# Altium footprint library Footprints.PcbLib: 236 footprints (part 14 of 15)
Each footprint in its own frame and in the unit in brackets; x right, y up, seen from the top. Pads: shape width x height; smd on the part's side, far side on the other; paste and mask are expansions set on the pad; w line width, h text height; cw(c..) or ccw(c..) is an arc to the next point about the centre after c.
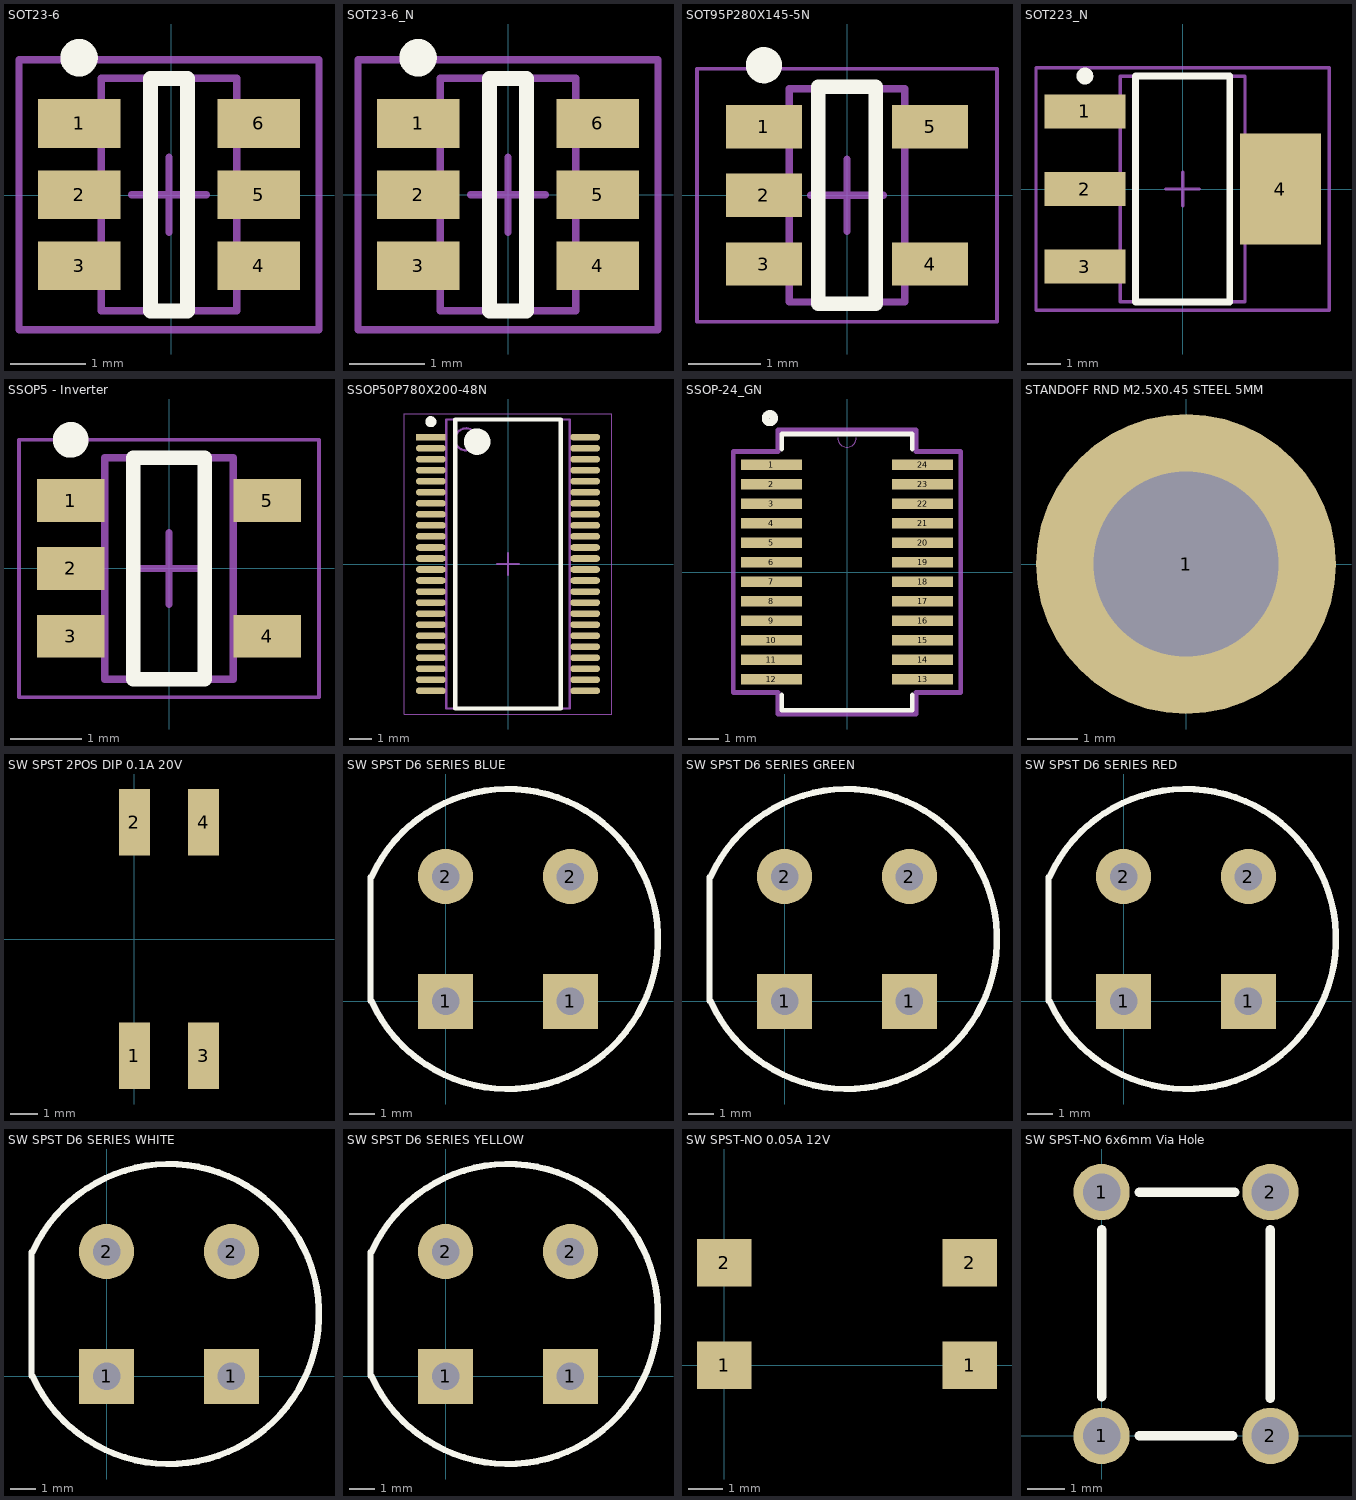
[diagram p13: the footprints below, top view; thin cyan lines are the x and y axes]

## SOT23-6 [mm]
pads (6):
  rect 1.1x0.65 smd: 1(-1.229,0.955) 2(-1.229,0.005) 3(-1.229,-0.945) 4(1.171,-0.945) 5(1.171,0.005) 6(1.171,0.955)
Top Overlay:
  circle w0.25: c-1.229,1.83 r0.125
  lines w0.2: -0.279,-1.545 0.221,-1.545 0.221,1.555 -0.279,1.555 -0.279,-1.545
Mechanical 13:
  lines w0.1: -0.929,-1.545 -0.929,1.555 0.871,1.555 0.871,-1.545 -0.929,-1.545
Mechanical 15:
  lines w0.1: -0.529,0.005 0.471,0.005 ; -0.029,-0.495 -0.029,0.505 ; -2.029,-1.795 -2.029,1.805 1.971,1.805 1.971,-1.795 -2.029,-1.795
3D body "IC REG BUCK 4.5V TO 17V, 5A.step": height 1.1, standoff 0, extent -1.525,-1.375 1.525,1.375

## SOT23-6_N [mm] "SOT23, 6-Leads, Body 2.9x1.6mm, Pitch 0.95mm, Lead Span 2.7mm, IPC Medium Density"
height 1.45
pads (6):
  rect 1.1x0.65 smd: 1(-1.2,0.95) 2(-1.2,0) 3(-1.2,-0.95) 4(1.2,-0.95) 5(1.2,0) 6(1.2,0.95)
Top Overlay:
  circle w0.25: c-1.2,1.825 r0.125
  lines w0.2: -0.25,-1.55 -0.25,1.55 0.25,1.55 0.25,-1.55 -0.25,-1.55
Mechanical 13:
  lines w0.1: -0.9,-1.55 0.9,-1.55 0.9,1.55 -0.9,1.55 -0.9,-1.55
Mechanical 15:
  lines w0.1: -0.5,0 0.5,0 ; 0,-0.5 0,0.5 ; -2,-1.8 2,-1.8 2,1.8 -2,1.8 -2,-1.8
3D body: height 1.45, standoff 0, extent -0.9,-1.55 0.9,1.55

## SOT95P280X145-5N [mm] "SOT23, 5-Leads, Body 2.95x2.80mm, Pitch 0.95mm, IPC Medium Density"
height 1.45
pads (5):
  rect 1.05x0.6 smd: 1(-1.15,0.95) 2(-1.15,0) 3(-1.15,-0.95) 4(1.15,-0.95) 5(1.15,0.95)
Top Overlay:
  circle w0.25: c-1.15,1.8 r0.125
  lines w0.2: -0.4,-1.5 0.4,-1.5 0.4,1.5 -0.4,1.5 -0.4,-1.5
Mechanical 13:
  lines w0.1: -0.8,-1.475 -0.8,1.475 0.8,1.475 0.8,-1.475 -0.8,-1.475
Mechanical 15:
  lines w0.05: -2.075,-1.75 -2.075,1.75 2.075,1.75 2.075,-1.75 -2.075,-1.75
  lines w0.1: -0.5,0 0.5,0 ; 0,-0.5 0,0.5
3D body "SOT95P280X145-5N.step": height 1.45, standoff 0, extent -1.4,-1.475 1.4,1.475

## SOT223_N [mm] "SOT223, 4-Leads, Body 6.5x3.5mm, Pitch 2.3mm, Lead Span 7mm, IPC Medium Density"
height 1.7
pads (4):
  rect 2.4x1 smd: 1(-2.9,2.3) 2(-2.9,0) 3(-2.9,-2.3)
  rect 2.4x3.3 smd: 4(2.9,0)
Top Overlay:
  circle w0.25: c-2.9,3.35 r0.125
  lines w0.2: -1.4,-3.35 1.4,-3.35 1.4,3.35 -1.4,3.35 -1.4,-3.35
Mechanical 13:
  lines w0.1: -1.85,-3.35 1.85,-3.35 1.85,3.35 -1.85,3.35 -1.85,-3.35
Mechanical 15:
  lines w0.1: -0.5,0 0.5,0 ; 0,-0.5 0,0.5 ; -4.35,-3.6 4.35,-3.6 4.35,3.6 -4.35,3.6 -4.35,-3.6
3D body "SOT223-3.step": height 1.6, standoff 0, extent -3.537,-3.3 3.537,3.2

## SSOP5 - Inverter [mm] "SSOP5, 5-Leads, Body 2.90x2.80mm, Pitch 0.95mm, IPC Medium Density"
height 1.2
pads (5):
  rect 0.95x0.6 smd: 1(-1.375,0.95) 2(-1.375,0) 3(-1.375,-0.95) 4(1.375,-0.95) 5(1.375,0.95)
Top Overlay:
  circle w0.25: c-1.375,1.8 r0.125
  lines w0.2: -0.5,-1.55 -0.5,1.55 0.5,1.55 0.5,-1.55 -0.5,-1.55
Mechanical 13:
  lines w0.1: -0.9,-1.55 0.9,-1.55 0.9,1.55 -0.9,1.55 -0.9,-1.55
Mechanical 15:
  lines w0.05: -2.1,-1.8 2.1,-1.8 2.1,1.8 -2.1,1.8 -2.1,-1.8
  lines w0.1: -0.5,0 0.5,0 ; 0,-0.5 0,0.5
3D body "SSOP5 - Inverter.step": height 1.2, standoff 0, extent -1.5,-1.55 1.5,1.55

## SSOP50P780X200-48N [mm] "SSOP, 48-Leads, Body 12.80x5.30mm, Pitch 0.50mm, IPC Medium Density"
height 2
pads (48):
  rect 1.35x0.3 smd: 1(-3.5,5.75)
  oval 1.35x0.3 smd: 2(-3.5,5.25) 3(-3.5,4.75) 4(-3.5,4.25) 5(-3.5,3.75) 6(-3.5,3.25) 7(-3.5,2.75) 8(-3.5,2.25) 9(-3.5,1.75) 10(-3.5,1.25) 11(-3.5,0.75) 12(-3.5,0.25) 13(-3.5,-0.25) 14(-3.5,-0.75) 15(-3.5,-1.25) 16(-3.5,-1.75) 17(-3.5,-2.25) 18(-3.5,-2.75) 19(-3.5,-3.25) 20(-3.5,-3.75) 21(-3.5,-4.25) 22(-3.5,-4.75) 23(-3.5,-5.25) 24(-3.5,-5.75) 25(3.5,-5.75) 26(3.5,-5.25) 27(3.5,-4.75) 28(3.5,-4.25) 29(3.5,-3.75) 30(3.5,-3.25) 31(3.5,-2.75) 32(3.5,-2.25) 33(3.5,-1.75) 34(3.5,-1.25) 35(3.5,-0.75) 36(3.5,-0.25) 37(3.5,0.25) 38(3.5,0.75) 39(3.5,1.25) 40(3.5,1.75) 41(3.5,2.25) 42(3.5,2.75) 43(3.5,3.25) 44(3.5,3.75) 45(3.5,4.25) 46(3.5,4.75) 47(3.5,5.25) 48(3.5,5.75)
Top Overlay:
  circle w0.25: c-3.5,6.45 r0.125
  circle w0.6: c-1.4,5.55 r0.3
  lines w0.2: -2.4,-6.55 -2.4,6.55 2.4,6.55 2.4,-6.55 -2.4,-6.55
Mechanical 13:
  circle w0.1: c-1.9,5.65 r0.5
  lines w0.1: -2.8,-6.55 -2.8,6.55 2.8,6.55 2.8,-6.55 -2.8,-6.55
Mechanical 15:
  lines w0.05: -4.7,-6.8 -4.7,6.8 4.7,6.8 4.7,-6.8 -4.7,-6.8
  lines w0.1: -0.5,0 0.5,0 ; 0,-0.5 0,0.5
3D body "SSOP50P780X200-48N.step": height 2, standoff 0, extent -3.9,-6.55 3.9,6.55

## SSOP-24_GN [mil]
pads (24):
  rect 78x14 smd: 1(-97,137.5) 2(-97,112.5) 3(-97,87.5) 4(-97,62.5) 5(-97,37.5) 6(-97,12.5) 7(-97,-12.5) 8(-97,-37.5) 9(-97,-62.5) 10(-97,-87.5) 11(-97,-112.5) 12(-97,-137.5) 13(97,-137.5) 14(97,-112.5) 15(97,-87.5) 16(97,-62.5) 17(97,-37.5) 18(97,-12.5) 19(97,12.5) 20(97,37.5) 21(97,62.5) 22(97,87.5) 23(97,112.5) 24(97,137.5)
Top Overlay:
  circle w10: c-98.94,197.2 r5.35
  lines w6: -83.5,-157.6 -83.5,-177 83.5,-177 83.5,-157.6 ; -83.5,157.6 -83.5,177 83.5,177 83.5,157.6
Mechanical 13:
  lines w0: -12,172 ccw(c0,172) 12,172
Mechanical 15:
  lines w6: -146,-154.5 -88.5,-154.5 -88.5,-182 88.5,-182 88.5,-154.5 146,-154.5 146,154.5 88.5,154.5 88.5,182 -88.5,182 -88.5,154.5 -146,154.5 -146,-154.5
3D body "SSOP-24_GN.stp": height 67.1, standoff 0, extent -122,-172 122,172
3D body: height 10, standoff 0, extent 0,0 10,10

## STANDOFF RND M2.5X0.45 STEEL 5MM [mm]
pads (1):
  round 6 hole 3.7: 1(0,0)
3D body "9774050151R (rev1).stp": height 5, standoff -1.4, extent -2.55,-2.547 2.55,2.547

## SW SPST 2POS DIP 0.1A 20V [mm] "Dip Switch SPST 2 Position Surface Mount Slide (Standard) Actuator 100mA 20VDC"
pads (4):
  rect 1.13x2.44 smd: 1(0,-4.3) 2(0,4.3) 3(2.54,-4.3) 4(2.54,4.3)
3D body: height 4.4, standoff 0.25, extent -2.18,-4.96 4.36,4.96

## SW SPST D6 SERIES BLUE [mm]
pads (4):
  rect 2.2x2.2 hole 1.1: 1(0,0) 1(5,0)
  round 2.2 hole 1.1: 2(0,5) 2(5,5)
Top Overlay:
  lines w0.254: -3,0.017 -3,4.983 ; -2.962,0.017 ccw(c2.5,2.5) -2.962,4.983
3D body "CU41MF0002FP-A.stp": height 6.17, standoff -4.55, extent -2.9,-3.5 8.5,8.5

## SW SPST D6 SERIES GREEN [mm]
pads (4):
  rect 2.2x2.2 hole 1.1: 1(0,0) 1(5,0)
  round 2.2 hole 1.1: 2(0,5) 2(5,5)
Top Overlay:
  lines w0.254: -3,0.017 -3,4.983 ; -2.962,0.017 ccw(c2.5,2.5) -2.962,4.983
3D body "CU41MF0002FP-A.stp": height 6.17, standoff -4.55, extent -2.9,-3.5 8.5,8.5

## SW SPST D6 SERIES RED [mm]
pads (4):
  rect 2.2x2.2 hole 1.1: 1(0,0) 1(5,0)
  round 2.2 hole 1.1: 2(0,5) 2(5,5)
Top Overlay:
  lines w0.254: -3,0.017 -3,4.983 ; -2.962,0.017 ccw(c2.5,2.5) -2.962,4.983
3D body "CU41MF0002FP-A.stp": height 6.17, standoff -4.55, extent -2.9,-3.5 8.5,8.5

## SW SPST D6 SERIES WHITE [mm]
pads (4):
  rect 2.2x2.2 hole 1.1: 1(0,0) 1(5,0)
  round 2.2 hole 1.1: 2(0,5) 2(5,5)
Top Overlay:
  lines w0.254: -3,0.017 -3,4.983 ; -2.962,0.017 ccw(c2.5,2.5) -2.962,4.983
3D body "CU41MF0002FP-A.stp": height 6.17, standoff -4.55, extent -2.9,-3.5 8.5,8.5

## SW SPST D6 SERIES YELLOW [mm]
pads (4):
  rect 2.2x2.2 hole 1.1: 1(0,0) 1(5,0)
  round 2.2 hole 1.1: 2(0,5) 2(5,5)
Top Overlay:
  lines w0.254: -3,0.017 -3,4.983 ; -2.962,0.017 ccw(c2.5,2.5) -2.962,4.983
3D body "CU41MF0002FP-A.stp": height 6.17, standoff -4.55, extent -2.9,-3.5 8.5,8.5

## SW SPST-NO 0.05A 12V [mm]
pads (4):
  rect 1.6x1.4 smd: 1(0,0) 1(7.2,0) 2(0,3) 2(7.2,3)
3D body "TL3305AFxxxxG.stp": height 3.7, standoff -0.1, extent 0,-0.75 7.5,3.75

## SW SPST-NO 6x6mm Via Hole [mm]
height 9.5
pads (4):
  round 1.5 hole 1: 1(0,0) 1(0,6.5) 2(4.5,0) 2(4.5,6.5)
Top Overlay:
  lines w0.254: 0,1.05 0,5.5 ; 1,0 3.5,0 ; 1,6.5 3.55,6.5 ; 4.5,1 4.5,5.5
3D body "1933083.stp": height 9.51, standoff -3.54, extent -0.75,-0.697 5.25,7.197